# Altium footprint library ComputeCores.PCBLIB: 18 footprints (part 1 of 2)
Each footprint in its own frame and in the unit in brackets; x right, y up, seen from the top. Pads: shape width x height; smd on the part's side, far side on the other; paste and mask are expansions set on the pad; w line width, h text height; cw(c..) or ccw(c..) is an arc to the next point about the centre after c.
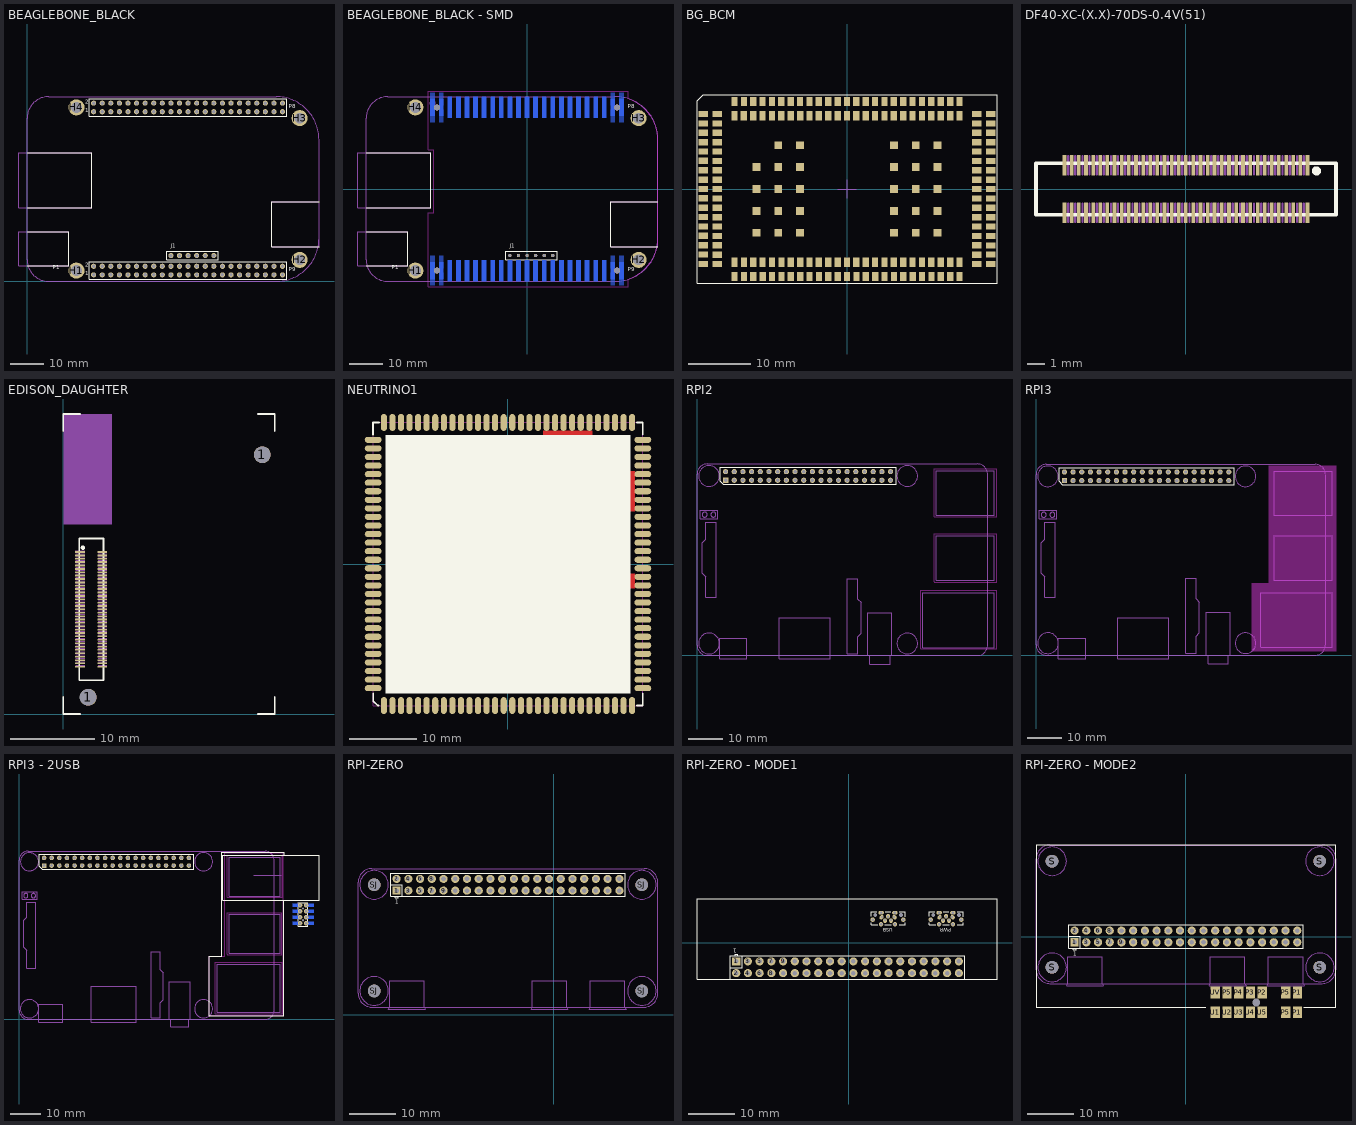
[diagram p0: the footprints below, top view; thin cyan lines are the x and y axes]

## BEAGLEBONE_BLACK [mil]
pads (102):
  round 187.5 hole 125: H1(575,125) H2(3175,250) H3(3175,1900) H4(575,2025)
  round 60 hole 40: J1.1(1675,300) J1.2(1775,300) J1.3(1875,300) J1.4(1975,300) J1.5(2075,300) J1.6(2175,300) P8.1(775,1975) P8.2(775,2075) P8.3(875,1975) P8.4(875,2075) P8.5(975,1975) P8.6(975,2075) P8.7(1075,1975) P8.8(1075,2075) P8.9(1175,1975) P8.10(1175,2075) P8.11(1275,1975) P8.12(1275,2075) P8.13(1375,1975) P8.14(1375,2075) P8.15(1475,1975) P8.16(1475,2075) P8.17(1575,1975) P8.18(1575,2075) P8.19(1675,1975) P8.20(1675,2075) P8.21(1775,1975) P8.22(1775,2075) P8.23(1875,1975) P8.24(1875,2075) P8.25(1975,1975) P8.26(1975,2075) P8.27(2075,1975) P8.28(2075,2075) P8.29(2175,1975) P8.30(2175,2075) P8.31(2275,1975) P8.32(2275,2075) P8.33(2375,1975) P8.34(2375,2075) P8.35(2475,1975) P8.36(2475,2075) P8.37(2575,1975) P8.38(2575,2075) P8.39(2675,1975) P8.40(2675,2075) P8.41(2775,1975) P8.42(2775,2075) P8.43(2875,1975) P8.44(2875,2075) P8.45(2975,1975) P8.46(2975,2075) P9.1(775,75) P9.2(775,175) P9.3(875,75) P9.4(875,175) P9.5(975,75) P9.6(975,175) P9.7(1075,75) P9.8(1075,175) P9.9(1175,75) P9.10(1175,175) P9.11(1275,75) P9.12(1275,175) P9.13(1375,75) P9.14(1375,175) P9.15(1475,75) P9.16(1475,175) P9.17(1575,75) P9.18(1575,175) P9.19(1675,75) P9.20(1675,175) P9.21(1775,75) P9.22(1775,175) P9.23(1875,75) P9.24(1875,175) P9.25(1975,75) P9.26(1975,175) P9.27(2075,75) P9.28(2075,175) P9.29(2175,75) P9.30(2175,175) P9.31(2275,75) P9.32(2275,175) P9.33(2375,75) P9.34(2375,175) P9.35(2475,75) P9.36(2475,175) P9.37(2575,75) P9.38(2575,175) P9.39(2675,75) P9.40(2675,175) P9.41(2775,75) P9.42(2775,175) P9.43(2875,75) P9.44(2875,175) P9.45(2975,75) P9.46(2975,175)
Top Overlay:
  lines w5: 0,182 485,182 485,575 0,575 ; 0,855 754,855 755,1495 0,1495 ; 3400,405 2850,405 2850,925 3400,925 ; 725,25 725,225 3025,225 3025,25 725,25 ; 725,1925 725,2125 3025,2125 3025,1925 725,1925 ; 1625,250 1625,350 2225,350 2225,250 1625,250
  text "P1" at 298,124 h77.5
  text "1" at 675,1950 h77.5
  text "2" at 675,2050 h77.5
  text "2" at 675,150 h77.5
  text "1" at 675,50 h77.5
  text "J1" at 1675,375 h77.5
  text "P8" at 3050,2000 h77.5
  text "P9" at 3050,100 h77.5
Mechanical 16:
  lines w5: -94.49,574.8 -94.49,181 485,181 485,575 -94.49,575 ; -94.49,855 754,855 755,1495 -94.49,1495 ; -94.49,855.12 -94.49,1494.88 ; 3400,405 2850,405 2850,925 3400,925 ; 3400,405.12 3400,500 ; 3400,500 cw(c2900,500) 2900,0 250,0 cw(c250,250) 0,250 0,1900 cw(c250,1900) 250,2150 2900,2150 cw(c2900,1650) 3400,1650 3400,500
3D body "BEAGLEBONE_BLACK.STEP": height 553.15, standoff -209.5, extent -98,0 3463.02,2151.95

## BEAGLEBONE_BLACK - SMD [mm]
pads (106):
  round 4.763 hole 3.175: H1(-33.02,-24.13) H2(33.02,-20.955) H3(33.02,20.955) H4(-33.02,24.13)
  round 1 hole 1: J1.1(-5.08,-19.685) J1.2(-2.54,-19.685) J1.3(0,-19.685) J1.4(2.54,-19.685) J1.5(5.08,-19.685) J1.6(7.62,-19.685)
  round 1.73 hole 1.73 unplated: None(-26.669,-24.133) None(-26.669,24.127) None(26.669,-24.133) None(26.669,24.127)
  rect 1.27x2.5 smd far side: P8.1(-27.94,22.86) P8.2(-27.94,25.4) P8.3(-25.4,22.86) P8.4(-25.4,25.4) P8.43(25.4,22.86) P8.44(25.4,25.4) P8.45(27.94,22.86) P8.46(27.94,25.4) P9.1(-27.94,-25.4) P9.2(-27.94,-22.86) P9.3(-25.4,-25.4) P9.4(-25.4,-22.86) P9.43(25.4,-25.4) P9.44(25.4,-22.86) P9.45(27.94,-25.4) P9.46(27.94,-22.86)
  rect 1.27x3.68 smd far side: P8.5(-22.86,22.86) P8.6(-22.86,25.4) P8.7(-20.32,22.86) P8.8(-20.32,25.4) P8.9(-17.78,22.86) P8.10(-17.78,25.4) P8.11(-15.24,22.86) P8.12(-15.24,25.4) P8.13(-12.7,22.86) P8.14(-12.7,25.4) P8.15(-10.16,22.86) P8.16(-10.16,25.4) P8.17(-7.62,22.86) P8.18(-7.62,25.4) P8.19(-5.08,22.86) P8.20(-5.08,25.4) P8.21(-2.54,22.86) P8.22(-2.54,25.4) P8.23(0,22.86) P8.24(0,25.4) P8.25(2.54,22.86) P8.26(2.54,25.4) P8.27(5.08,22.86) P8.28(5.08,25.4) P8.29(7.62,22.86) P8.30(7.62,25.4) P8.31(10.16,22.86) P8.32(10.16,25.4) P8.33(12.7,22.86) P8.34(12.7,25.4) P8.35(15.24,22.86) P8.36(15.24,25.4) P8.37(17.78,22.86) P8.38(17.78,25.4) P8.39(20.32,22.86) P8.40(20.32,25.4) P8.41(22.86,22.86) P8.42(22.86,25.4) P9.5(-22.86,-25.4) P9.6(-22.86,-22.86) P9.7(-20.32,-25.4) P9.8(-20.32,-22.86) P9.9(-17.78,-25.4) P9.10(-17.78,-22.86) P9.11(-15.24,-25.4) P9.12(-15.24,-22.86) P9.13(-12.7,-25.4) P9.14(-12.7,-22.86) P9.15(-10.16,-25.4) P9.16(-10.16,-22.86) P9.17(-7.62,-25.4) P9.18(-7.62,-22.86) P9.19(-5.08,-25.4) P9.20(-5.08,-22.86) P9.21(-2.54,-25.4) P9.22(-2.54,-22.86) P9.23(0,-25.4) P9.24(0,-22.86) P9.25(2.54,-25.4) P9.26(2.54,-22.86) P9.27(5.08,-25.4) P9.28(5.08,-22.86) P9.29(7.62,-25.4) P9.30(7.62,-22.86) P9.31(10.16,-25.4) P9.32(10.16,-22.86) P9.33(12.7,-25.4) P9.34(12.7,-22.86) P9.35(15.24,-25.4) P9.36(15.24,-22.86) P9.37(17.78,-25.4) P9.38(17.78,-22.86) P9.39(20.32,-25.4) P9.40(20.32,-22.86) P9.41(22.86,-25.4) P9.42(22.86,-22.86)
Bottom Layer:
  region: 26.034,28.443 26.034,25.273 25.524,24.763 24.764,24.763 24.764,28.443
  region: 27.304,28.443 27.304,25.273 27.814,24.763 28.574,24.763 28.574,28.443
  region: 26.034,19.811 26.034,22.981 25.524,23.491 24.764,23.491 24.764,19.811
  region: 27.304,19.811 27.304,22.981 27.814,23.491 28.574,23.491 28.574,19.811
  region: -27.304,19.811 -27.304,22.981 -27.814,23.491 -28.574,23.491 -28.574,19.811
  region: -26.034,19.811 -26.034,22.981 -25.524,23.491 -24.764,23.491 -24.764,19.811
  region: -27.304,28.443 -27.304,25.273 -27.814,24.763 -28.574,24.763 -28.574,28.443
  region: -26.034,28.443 -26.034,25.273 -25.524,24.763 -24.764,24.763 -24.764,28.443
  region: -26.034,-19.817 -26.034,-22.987 -25.524,-23.497 -24.764,-23.497 -24.764,-19.817
  region: -27.304,-19.817 -27.304,-22.987 -27.814,-23.497 -28.574,-23.497 -28.574,-19.817
  region: -26.034,-28.449 -26.034,-25.279 -25.524,-24.769 -24.764,-24.769 -24.764,-28.449
  region: -27.304,-28.449 -27.304,-25.279 -27.814,-24.769 -28.574,-24.769 -28.574,-28.449
  region: 27.304,-28.449 27.304,-25.279 27.814,-24.769 28.574,-24.769 28.574,-28.449
  region: 26.034,-28.449 26.034,-25.279 25.524,-24.769 24.764,-24.769 24.764,-28.449
  region: 27.304,-19.817 27.304,-22.987 27.814,-23.497 28.574,-23.497 28.574,-19.817
  region: 26.034,-19.817 26.034,-22.987 25.524,-23.497 24.764,-23.497 24.764,-19.817
Top Overlay:
  rectangle: -5.405,-20.01 -4.755,-19.36
  lines w0.127: -47.625,-22.682 -35.306,-22.682 -35.306,-12.7 -47.625,-12.7 ; -47.625,-5.588 -28.473,-5.588 -28.448,10.668 -47.625,10.668 ; 38.735,-17.018 24.765,-17.018 24.765,-3.81 38.735,-3.81 ; -6.35,-20.955 -6.35,-18.415 8.89,-18.415 8.89,-20.955 -6.35,-20.955
  text "P1" at -40.056,-24.155 h1.97
  text "J1" at -5.08,-17.78 h1.97
  text "P8" at 29.845,23.495 h1.97
  text "P9" at 29.845,-24.765 h1.97
Bottom Overlay:
  lines w0.127: -29.21,-26.67 29.21,-26.67 29.21,-21.59 -29.21,-21.59 -29.21,-26.67 ; -29.21,21.59 -29.21,26.67 29.21,26.67 29.21,21.59 -29.21,21.59
  text "2" at -29.58,24.64 h1.97
  text "1" at -29.58,22.1 h1.97
  text "2" at -29.58,-23.345 h1.97
  text "1" at -29.58,-25.885 h1.97
Keep-Out Layer:
  lines w0.127: -29.21,-28.95 -29.21,-27.305 -29.21,-22.638 -29.21,-6.985 -27.559,-6.985 -27.559,11.684 -29.21,11.684 -29.21,28.95 30,28.95 30,26.647 cw(c26.013,14.537) 38.75,15.075 38.75,-15.075 cw(c26.013,-14.537) 30,-26.647 30,-28.95 -29.21,-28.95
Mechanical 4:
  circle w0.4: c-27.94,25.4 r0.662
Mechanical 16:
  lines w0.127: -50.025,-12.705 -50.025,-22.708 -35.306,-22.708 -35.306,-12.7 -50.025,-12.7 ; -50.025,-5.588 -28.473,-5.588 -28.448,10.668 -50.025,10.668 ; -50.025,-5.585 -50.025,10.665 ; 38.735,-17.018 24.765,-17.018 24.765,-3.81 38.735,-3.81 ; 38.735,-17.015 38.735,-14.605 ; 38.735,-14.605 cw(c26.035,-14.605) 26.035,-27.305 -41.275,-27.305 cw(c-41.275,-20.955) -47.625,-20.955 -47.625,20.955 cw(c-41.275,20.955) -41.275,27.305 26.035,27.305 cw(c26.035,14.605) 38.735,14.605 38.735,-14.605
3D body "BEAGLEBONE_BLACK.STEP": height 17.93, standoff -1.44, extent -50.114,-27.305 40.336,27.355
3D body "TSM-123-01-T-DV-A.stp": height 9.66, standoff -1.26, extent -29.232,20.356 29.188,28.053
3D body "TSM-123-01-T-DV-A.stp": height 9.66, standoff -1.26, extent -29.232,-27.904 29.188,-20.207

## BG_BCM [mm]
pads (197):
  rect 1.5x1 smd: 1(-23,12) 2(-23,10.5) 3(-23,9) 4(-23,7.5) 5(-23,6) 6(-23,4.5) 7(-23,3) 8(-23,1.5) 9(-23,0) 10(-23,-1.5) 11(-23,-3) 12(-23,-4.5) 13(-23,-6) 14(-23,-7.5) 15(-23,-9) 16(-23,-10.5) 17(-23,-12) 18(-20.75,12) 19(-20.75,10.5) 20(-20.75,9) 21(-20.75,7.5) 22(-20.75,6) 23(-20.75,4.5) 24(-20.75,3) 25(-20.75,1.5) 26(-20.75,0) 27(-20.75,-1.5) 28(-20.75,-3) 29(-20.75,-4.5) 30(-20.75,-6) 31(-20.75,-7.5) 32(-20.75,-9) 33(-20.75,-10.5) 34(-20.75,-12) 85(23,-12) 86(23,-10.5) 87(23,-9.025) 88(23,-7.5) 89(23,-6) 90(23,-4.5) 91(23,-3) 92(23,-1.5) 93(23,0) 94(23,1.5) 95(23,3) 96(23,4.5) 97(23,6) 98(23,7.5) 99(23,9) 100(23,10.5) 101(23,12) 102(20.75,-12) 103(20.75,-10.5) 104(20.75,-9) 105(20.75,-7.5) 106(20.75,-6) 107(20.75,-4.5) 108(20.75,-3) 109(20.75,-1.5) 110(20.75,0) 111(20.75,1.5) 112(20.75,3) 113(20.75,4.5) 114(20.75,6) 115(20.75,7.5) 116(20.75,9) 117(20.75,10.5) 118(20.75,12)
  rect 1x1.5 smd: 35(-18,-14) 36(-16.5,-14) 37(-15,-14) 38(-13.5,-14) 39(-12,-14) 40(-10.5,-14) 41(-9,-14) 42(-7.5,-14) 43(-6,-14) 44(-4.5,-14) 45(-3,-14) 46(-1.5,-14) 47(0,-14) 48(1.5,-14) 49(3,-14) 50(4.5,-14) 51(6,-14) 52(7.5,-14) 53(9,-14) 54(10.5,-14) 55(12,-14) 56(13.5,-14) 57(15,-14) 58(16.5,-14) 59(18,-14) 60(-18,-11.75) 61(-16.5,-11.75) 62(-15,-11.75) 63(-13.5,-11.75) 64(-12,-11.75) 65(-10.5,-11.75) 66(-9,-11.75) 67(-7.5,-11.75) 68(-6,-11.75) 69(-4.5,-11.75) 70(-3,-11.75) 71(-1.5,-11.75) 72(0,-11.75) 73(1.5,-11.75) 74(3,-11.75) 75(4.5,-11.75) 76(6,-11.75) 77(7.5,-11.75) 78(9,-11.75) 79(10.5,-11.75) 80(12,-11.75) 81(13.5,-11.75) 82(15,-11.75) 83(16.5,-11.75) 84(18,-11.75) 119(18,14) 120(16.5,14) 121(15,14) 122(13.5,14) 123(12,14) 124(10.5,14) 125(9,14) 126(7.5,14) 127(6,14) 128(4.5,14) 129(3,14) 130(1.5,14) 131(0,14) 132(-1.5,14) 133(-3,14) 134(-4.5,14) 135(-6,14) 136(-7.5,14) 137(-9,14) 138(-10.5,14) 139(-12,14) 140(-13.5,14) 141(-15,14) 142(-16.5,14) 143(-18,14) 144(18,11.75) 145(16.5,11.75) 146(15,11.75) 147(13.5,11.75) 148(12,11.75) 149(10.5,11.75) 150(9,11.75) 151(7.5,11.75) 152(6,11.75) 153(4.5,11.75) 154(3,11.75) 155(1.5,11.75) 156(0,11.75) 157(-1.5,11.75) 158(-3,11.75) 159(-4.5,11.75) 160(-6,11.75) 161(-7.5,11.75) 162(-9,11.75) 163(-10.5,11.75) 164(-12,11.75) 165(-13.5,11.75) 166(-15,11.75) 167(-16.5,11.75) 168(-18,11.75)
  rect 1.25x1.25 smd: A2(-14.5,3.5) A3(-14.5,0) A4(-14.5,-3.5) A5(-14.5,-7) B1(-11,7) B2(-11,3.5) B3(-11,0) B4(-11,-3.5) B5(-11,-7) C1(-7.5,7) C2(-7.5,3.5) C3(-7.5,0) C4(-7.5,-3.5) C5(-7.5,-7) G1(7.5,7) G2(7.5,3.5) G3(7.5,0) G4(7.5,-3.5) G5(7.5,-7) H1(11,7) H2(11,3.5) H3(11,0) H4(11,-3.5) H5(11,-7) I1(14.5,7) I2(14.5,3.5) I3(14.5,0) I4(14.5,-3.5) I5(14.5,-7)
Top Overlay:
  lines w0.2: -24,-15.11 -24,14.1 -22.99,15.11 24,15.11 24,-15.11 -24,-15.11
Mechanical 2:
  lines w0.2: -1.5,0 0,0 ; 0,-1.5 0,0 ; 0,1.5 0,0 ; 1.5,0 0,0
3D body "CM01_BeagleCORE.step": height 3.23, standoff 0.01, extent -24,-15.1 24,15.1

## DF40-XC-(X.X)-70DS-0.4V(51) [mil]
pads (70):
  rect 8x45 smd: 1(268,52) 2(268,-51.97) 3(252,52) 4(252,-51.97) 5(237,52) 6(237,-51.97) 7(221,52) 8(221,-51.97) 9(205,52) 10(205,-51.97) 11(189,52) 12(189,-51.97) 13(174,52) 14(174,-51.97) 15(158,52) 16(158,-51.97) 17(142,52) 18(142,-51.97) 19(126,52) 20(126,-51.97) 21(111,52) 22(111,-51.97) 23(95,52) 24(95,-51.97) 25(79,52) 26(79,-51.97) 27(63,52) 28(63,-51.97) 29(48,52) 30(48,-51.97) 31(32,52) 32(32,-51.97) 33(16,52) 34(16,-51.97) 35(0,52) 36(0,-51.97) 37(-15.75,52) 38(-15.75,-51.97) 39(-31.5,52) 40(-31.5,-51.97) 41(-47.24,52) 42(-47.24,-51.97) 43(-62.99,52) 44(-62.99,-51.97) 45(-78.74,52) 46(-78.74,-51.97) 47(-94.49,52) 48(-94.49,-51.97) 49(-110.24,52) 50(-110.24,-51.97) 51(-125.98,52) 52(-125.98,-51.97) 53(-141.73,52) 54(-141.73,-51.97) 55(-157.48,52) 56(-157.48,-51.97) 57(-173.23,52) 58(-173.23,-51.97) 59(-188.98,52) 60(-188.98,-51.97) 61(-204.72,52) 62(-204.72,-51.97) 63(-220.47,52) 64(-220.47,-51.97) 65(-236.22,52) 66(-236.22,-51.97) 67(-251.97,52) 68(-251.97,-51.97) 69(-267.72,52) 70(-267.72,-51.97)
Top Overlay:
  circle w12: c288,40 r4
  lines w8: -330.71,-56.69 -330.71,57 331,57 331,-56.69 -330.71,-56.69
Mechanical 8:
  lines w5: -259.84,-72.24 -259.84,-32.09 ; -259.84,32 -259.84,73 ; -244.09,-72.24 -244.09,-32.09 ; -244.09,32 -244.09,73 ; -228.35,-72.24 -228.35,-32.09 ; -228.35,32 -228.35,73 ; -212.6,-72.24 -212.6,-32.09 ; -212.6,32 -212.6,73 ; -196.85,-72.24 -196.85,-32.09 ; -196.85,32 -196.85,73 ; -181.1,-72.24 -181.1,-32.09 ; -181.1,32 -181.1,73 ; -165.35,-72.24 -165.35,-32.09 ; -165.35,32 -165.35,73 ; -149.61,-72.24 -149.61,-32.09 ; -149.61,32 -149.61,73 ; -133.86,-72.24 -133.86,-32.09 ; -133.86,32 -133.86,73 ; -118.11,-72.24 -118.11,-32.09 ; -118.11,32 -118.11,73 ; -102.36,-72.24 -102.36,-32.09 ; -102.36,32 -102.36,73 ; -86.61,-72.24 -86.61,-32.09 ; -86.61,32 -86.61,73 ; -70.87,-72.24 -70.87,-32.09 ; -70.87,32 -70.87,73 ; -55.12,-72.24 -55.12,-32.09 ; -55.12,32 -55.12,73 ; -39.37,-72.24 -39.37,-32.09 ; -39.37,32 -39.37,73 ; -23.62,-72.24 -23.62,-32.09 ; -23.62,32 -23.62,73 ; -7.87,-72.24 -7.87,-32.09 ; -7.87,32 -7.87,73 ; 8,-72.24 8,-32.09 ; 8,32 8,73 ; 24,-72.24 24,-32.09 ; 24,32 24,73 ; 40,-72.24 40,-32.09 ; 40,32 40,73 ; 56,-72.24 56,-32.09 ; 56,32 56,73 ; 71,-72.24 71,-32.09 ; 71,32 71,73 ; 87,-72.24 87,-32.09 ; 87,32 87,73 ; 103,-72.24 103,-32.09 ; 103,32 103,73 ; 119,-72.24 119,-32.09 ; 119,32 119,73 ; 134,-72.24 134,-32.09 ; 134,32 134,73 ; 150,-72.24 150,-32.09 ; 150,32 150,73 ; 166,-72.24 166,-32.09 ; 166,32 166,73 ; 182,-72.24 182,-32.09 ; 182,32 182,73 ; 197,-72.24 197,-32.09 ; 197,32 197,73 ; 213,-72.24 213,-32.09 ; 213,32 213,73 ; 229,-72.24 229,-32.09 ; 229,32 229,73 ; 245,-72.24 245,-32.09 ; 245,32 245,73 ; 260,-72.24 260,-32.09 ; 260,32 260,73
3D body "DF40C(2.0)-70DS.stp": height 80.12, standoff 3.35, extent -326.77,-67.07 326.77,66

## EDISON_DAUGHTER [mil]
pads (72):
  rect 45x8 smd: 1(78,755) 2(182,755) 3(78,739) 4(182,739) 5(78,724) 6(182,724) 7(78,708) 8(182,708) 9(78,692) 10(182,692) 11(78,676) 12(182,676) 13(78,661) 14(182,661) 15(78,645) 16(182,645) 17(78,629) 18(182,629) 19(78,613) 20(182,613) 21(78,598) 22(182,598) 23(78,582) 24(182,582) 25(78,566) 26(182,566) 27(78,550) 28(182,550) 29(78,535) 30(182,535) 31(78,519) 32(182,519) 33(78,503) 34(182,503) 35(78,488) 36(182,488) 37(78,472) 38(182,472) 39(78,456) 40(182,456) 41(78,440) 42(182,440) 43(78,425) 44(182,425) 45(78,409) 46(182,409) 47(78,393) 48(182,393) 49(78,377) 50(182,377) 51(78,362) 52(182,362) 53(78,346) 54(182,346) 55(78,330) 56(182,330) 57(78,314) 58(182,314) 59(78,299) 60(182,299) 61(78,283) 62(182,283) 63(78,267) 64(182,267) 65(78,251) 66(182,251) 67(78,236) 68(182,236) 69(78,220) 70(182,220)
  round 79 hole 79: 1(116,78) 1(927,1208)
Top Overlay:
  circle w12: c91,775 r4
  lines w8: 0,79 0,0 79,0 ; 0,1319 0,1398 79,1398 ; 906,0 985,0 985,79 ; 906,1398 985,1398 985,1319 ; 74,157 187,157 187,818 74,818 74,157
Mechanical 8:
  lines w1: 56,761 101,761
  lines w5: 58,228 99,228 ; 58,243 99,243 ; 58,259 99,259 ; 58,275 99,275 ; 58,291 99,291 ; 58,306 99,306 ; 58,322 99,322 ; 58,338 99,338 ; 58,354 99,354 ; 58,369 99,369 ; 58,385 99,385 ; 58,401 99,401 ; 58,417 99,417 ; 58,432 99,432 ; 58,448 99,448 ; 58,464 99,464 ; 58,480 99,480 ; 58,495 99,495 ; 58,511 99,511 ; 58,527 99,527 ; 58,543 99,543 ; 58,558 99,558 ; 58,574 99,574 ; 58,590 99,590 ; 58,606 99,606 ; 58,621 99,621 ; 58,637 99,637 ; 58,653 99,653 ; 58,669 99,669 ; 58,684 99,684 ; 58,700 99,700 ; 58,716 99,716 ; 58,732 99,732 ; 58,747 99,747 ; 163,228 203,228 ; 163,243 203,243 ; 163,259 203,259 ; 163,275 203,275 ; 163,291 203,291 ; 163,306 203,306 ; 163,322 203,322 ; 163,338 203,338 ; 163,354 203,354 ; 163,369 203,369 ; 163,385 203,385 ; 163,401 203,401 ; 163,417 203,417 ; 163,432 203,432 ; 163,448 203,448 ; 163,464 203,464 ; 163,480 203,480 ; 163,495 203,495 ; 163,511 203,511 ; 163,527 203,527 ; 163,543 203,543 ; 163,558 203,558 ; 163,574 203,574 ; 163,590 203,590 ; 163,606 203,606 ; 163,621 203,621 ; 163,637 203,637 ; 163,653 203,653 ; 163,669 203,669 ; 163,684 203,684 ; 163,700 203,700 ; 163,716 203,716 ; 163,732 203,732 ; 163,747 203,747
Mechanical 27:
  region: 228,1398 0,1398 0,882 228,882
Mechanical 28:
  region: 228,1398 0,1398 0,882 228,882
3D body "inteledison_ok_colors.step": height 172.95, standoff 15.47, extent 9,0 993.25,1397.64
3D body "DF40C(2.0)-70DS.stp": height 75.12, standoff -1.65, extent 63.47,160.87 196.54,814.42

## NEUTRINO1 [mm]
pads (120):
  oval 0.9x2.5 smd mask+0.14: 1(-18.415,-21) 2(-17.145,-21) 3(-15.875,-21) 4(-14.605,-21) 5(-13.335,-21) 6(-12.065,-21) 7(-10.795,-21) 8(-9.525,-21) 9(-8.255,-21) 10(-6.985,-21) 11(-5.715,-21) 12(-4.445,-21) 13(-3.175,-21) 14(-1.905,-21) 15(-0.635,-21) 16(0.635,-21) 17(1.905,-21) 18(3.175,-21) 19(4.445,-21) 20(5.715,-21) 21(6.985,-21) 22(8.255,-21) 23(9.525,-21) 24(10.795,-21) 25(12.065,-21) 26(13.335,-21) 27(14.605,-21) 28(15.875,-21) 29(17.145,-21) 30(18.415,-21) 61(18.415,21) 62(17.145,21) 63(15.875,21) 64(14.605,21) 65(13.335,21) 66(12.065,21) 67(10.795,21) 68(9.525,21) 69(8.255,21) 70(6.985,21) 71(5.715,21) 72(4.445,21) 73(3.175,21) 74(1.905,21) 75(0.635,21) 76(-0.635,21) 77(-1.905,21) 78(-3.175,21) 79(-4.445,21) 80(-5.715,21) 81(-6.985,21) 82(-8.255,21) 83(-9.525,21) 84(-10.795,21) 85(-12.065,21) 86(-13.335,21) 87(-14.605,21) 88(-15.875,21) 89(-17.145,21) 90(-18.415,21)
  oval 2.5x0.9 smd mask+0.14: 31(20,-18.415) 32(20,-17.145) 33(20,-15.875) 34(20,-14.605) 35(20,-13.335) 36(20,-12.065) 37(20,-10.795) 38(20,-9.525) 39(20,-8.255) 40(20,-6.985) 41(20,-5.715) 42(20,-4.445) 43(20,-3.175) 44(20,-1.905) 45(20,-0.635) 46(20,0.635) 47(20,1.905) 48(20,3.175) 49(20,4.445) 50(20,5.715) 51(20,6.985) 52(20,8.255) 53(20,9.525) 54(20,10.795) 55(20,12.065) 56(20,13.335) 57(20,14.605) 58(20,15.875) 59(20,17.145) 60(20,18.415) 91(-20,18.415) 92(-20,17.145) 93(-20,15.875) 94(-20,14.605) 95(-20,13.335) 96(-20,12.065) 97(-20,10.795) 98(-20,9.525) 99(-20,8.255) 100(-20,6.985) 101(-20,5.715) 102(-20,4.445) 103(-20,3.175) 104(-20,1.905) 105(-20,0.635) 106(-20,-0.635) 107(-20,-1.905) 108(-20,-3.175) 109(-20,-4.445) 110(-20,-5.715) 111(-20,-6.985) 112(-20,-8.255) 113(-20,-9.525) 114(-20,-10.795) 115(-20,-12.065) 116(-20,-13.335) 117(-20,-14.605) 118(-20,-15.875) 119(-20,-17.145) 120(-20,-18.415)
Top Layer:
  region: 12.515,19.788 5.265,19.788 5.265,19.213 5.261,19.135 5.231,18.981 5.171,18.837 5.084,18.706 4.974,18.596 4.843,18.509 4.699,18.449 4.545,18.419 4.467,18.415 -6.471,18.415 -6.559,18.416 -6.732,18.382 -6.895,18.316 -7.041,18.219 -7.166,18.095 -7.264,17.949 -7.332,17.786 -7.366,17.614 -7.366,17.526 -7.366,-4.143 -7.366,-4.21 -7.34,-4.342 -7.288,-4.467 -7.214,-4.578 -7.119,-4.674 -7.007,-4.748 -6.882,-4.8 -6.75,-4.826 -6.683,-4.826 16.917,-4.826 17.039,-4.826 17.265,-4.732 17.438,-4.559 17.532,-4.333 17.532,-4.211 17.532,-4.032 17.54,-3.952 17.601,-3.805 17.713,-3.693 17.86,-3.632 17.94,-3.624 18.771,-3.624 18.771,-1.456 17.976,-1.456 17.889,-1.448 17.729,-1.381 17.607,-1.259 17.54,-1.099 17.532,-1.012 17.532,7.207 17.563,7.311 17.667,7.503 17.817,7.659 18.004,7.77 18.107,7.806 18.771,7.806 18.771,13.784 18.159,13.784 18.037,13.796 17.81,13.889 17.637,14.062 17.544,14.288 17.532,14.411 17.532,17.993 17.532,18.077 17.468,18.232 17.349,18.351 17.194,18.415 17.11,18.415 13.444,18.415 13.357,18.415 13.185,18.44 13.022,18.499 12.873,18.588 12.744,18.704 12.64,18.844 12.566,19.001 12.524,19.169 12.515,19.256
Top Overlay:
  circle w0.254: c-17.257,-18.354 r0.559
  rectangle: -18.161,-19.177 18.161,19.126
  lines w0.254: -20.025,19.187 -20.025,21 -19.136,21 ; -20,-19.167 -20,-20.335 -19.34,-20.996 -19.162,-20.996 ; 19.141,-20.996 20,-20.996 20,-19.167 ; 19.141,21 20,21 20,19.187
Keep-Out Layer:
  lines w0.127: -20,-21 -20,21 20,21 20,-21 -20,-21
3D body "NEUTRINO1SOM.step": height 3.02, standoff 0.01, extent -20,-21 20,21

## RPI2 [mil]
pads (40):
  rect 60x60 hole 40: 1(330,2017)
  round 60 hole 40: 2(329,2117) 3(429,2017) 4(429,2117) 5(529,2017) 6(529,2117) 7(629,2017) 8(629,2117) 9(729,2017) 10(729,2117) 11(829,2017) 12(829,2117) 13(929,2017) 14(929,2117) 15(1029,2017) 16(1029,2117) 17(1129,2017) 18(1129,2117) 19(1229,2017) 20(1229,2117) 21(1329,2017) 22(1329,2117) 23(1429,2017) 24(1429,2117) 25(1529,2017) 26(1529,2117) 27(1629,2017) 28(1629,2117) 29(1729,2017) 30(1729,2117) 31(1829,2017) 32(1829,2117) 33(1929,2017) 34(1929,2117) 35(2029,2017) 36(2029,2117) 37(2129,2017) 38(2129,2117) 39(2229,2017) 40(2229,2117)
Top Overlay:
  lines w5: 266,2008 266,2166 2293,2166 2293,1969 305,1969 266,2008
Keep-Out Layer:
  lines w10: 2575,75 2575,750 3455,750 3455,80 3450,75 2575,75 ; 2730,850 2730,1400 3450,1400 3450,845 2735,845 2730,850 ; 2730,1600 2730,2150 3455,2150 3455,1600 2730,1600
Mechanical 14:
  circle w5: c138,138 r120
  circle w5: c2422,138 r119
  circle w5: c2422,2067 r119
  circle w5: c138,2067 r119
  circle w5: c89,1622 r29
  circle w5: c189,1622 r29
  lines w5: 1969,0 119,0 cw(c119,119) 0,119 0,2087 cw(c118.5,2086.5) 119,2205 3229,2205 cw(c3229,2087) 3347,2087 3347,119 cw(c3228.5,118.5) 3229,0 2245,0 ; 1969,0 1989,0 ; 1969,0 1969,493 2245,493 2245,0 ; 1989,0 2225,0 ; 1989,0 1989,-98.43 2225,-98.43 2225,0 ; 2225,0 2245,0 ; 40,1575 40,1674 237,1674 237,1575 40,1575 ; 63,945 103,906 103,670 221,670 221,1536 103,1536 103,1339 63,1300 63,945 ; 260,-39.37 575,-39.37 575,197 260,197 260,-39.37 ; 945,-39.37 1536,-39.37 1536,434 945,434 945,-39.37 ; 1733,20 1733,886 1851,886 1851,650 1890,611 1890,256 1851,217 1851,20 1733,20 ; 2599,91 3426,91 3426,721 2599,721 2599,91 ; 2756,867 3426,867 3426,1378 2756,1378 2756,867 ; 2756,1615 2756,2126 3426,2126 3426,1615 3339,1615 2756,1615
  text "RUN" at 288,1575 h49.6
  text "J8" at 237,1930 h49.6
  text "J1" at 209,8 h49.6
  text "J6" at 1489,445 h49.6
  text "J3" at 1721,815 h49.6
  text "J7" at 2304,48 h49.6
  text "J10" at 3327,764 h49.6
  text "J11" at 3331,1422 h49.6
  text "J12" at 3300,2166 h49.6
  text "GPIO" at 552,1890 h62
  text "DISPLAY" at 355,985 h62
  text "PWR IN" at 638,4 h62
  text "HDMI" at 1626,16 h62
  text "CAMERA" at 1709,312 h62
  text "A/V" at 1953,16 h62
  text "ETHERNET" at 3268,79 h62
  text "USB" at 3327,855 h62
  text "USB" at 3213,1560 h62
  text "J4" at 237,1457 h49.6
  text "Raspberry Pi 2 Model B V1.1" at 1150,1700 h108.5
3D body "61304021821.stp": height 337.32, standoff -119.37, extent 267.31,1970 2287,2170
3D body "raspberrypi2_ok_colors1.step": height 558.88, standoff -179.17, extent -80.17,-101 3448.17,2194.27

## RPI3 [mil]
pads (40):
  rect 60x60 hole 40: 1(330,2017)
  round 60 hole 40: 2(329,2117) 3(429,2017) 4(429,2117) 5(529,2017) 6(529,2117) 7(629,2017) 8(629,2117) 9(729,2017) 10(729,2117) 11(829,2017) 12(829,2117) 13(929,2017) 14(929,2117) 15(1029,2017) 16(1029,2117) 17(1129,2017) 18(1129,2117) 19(1229,2017) 20(1229,2117) 21(1329,2017) 22(1329,2117) 23(1429,2017) 24(1429,2117) 25(1529,2017) 26(1529,2117) 27(1629,2017) 28(1629,2117) 29(1729,2017) 30(1729,2117) 31(1829,2017) 32(1829,2117) 33(1929,2017) 34(1929,2117) 35(2029,2017) 36(2029,2117) 37(2129,2017) 38(2129,2117) 39(2229,2017) 40(2229,2117)
Top Overlay:
  lines w5: 266,2008 266,2166 2293,2166 2293,1969 305,1969 266,2008
Keep-Out Layer:
  board cut-out: 2498,51 2498,829 2699,829 2699,2188 3468,2188 3468,51
Keep-Out Layer:
  lines w10: 2498,51 3468,51 3468,2188 2699,2188 2699,829 2498,829 2498,51 ; 2575,75 2575,750 3455,750 3455,80 3450,75 2575,75 ; 2730,850 2730,1400 3450,1400 3450,845 2735,845 2730,850 ; 2730,1600 2730,2150 3455,2150 3455,1600 2730,1600
Mechanical 14:
  circle w5: c138,138 r120
  circle w5: c2422,138 r119
  circle w5: c2422,2067 r119
  circle w5: c138,2067 r119
  circle w5: c89,1622 r29
  circle w5: c189,1622 r29
  lines w5: 1969,0 119,0 cw(c119,119) 0,119 0,2087 cw(c118.5,2086.5) 119,2205 3229,2205 cw(c3229,2087) 3347,2087 3347,119 cw(c3228.5,118.5) 3229,0 2245,0 ; 1969,0 1989,0 ; 1969,0 1969,493 2245,493 2245,0 ; 1989,0 2225,0 ; 1989,0 1989,-98.43 2225,-98.43 2225,0 ; 2225,0 2245,0 ; 40,1575 40,1674 237,1674 237,1575 40,1575 ; 63,945 103,906 103,670 221,670 221,1536 103,1536 103,1339 63,1300 63,945 ; 260,-39.37 575,-39.37 575,197 260,197 260,-39.37 ; 945,-39.37 1536,-39.37 1536,434 945,434 945,-39.37 ; 1733,20 1733,886 1851,886 1851,650 1890,611 1890,256 1851,217 1851,20 1733,20 ; 2599,91 3426,91 3426,721 2599,721 2599,91 ; 2756,867 3426,867 3426,1378 2756,1378 2756,867 ; 2756,1615 2756,2126 3426,2126 3426,1615 3339,1615 2756,1615
  text "RUN" at 288,1575 h49.6
  text "J8" at 237,1930 h49.6
  text "J1" at 209,8 h49.6
  text "J6" at 1489,445 h49.6
  text "J3" at 1721,815 h49.6
  text "J7" at 2304,48 h49.6
  text "J10" at 3327,764 h49.6
  text "J11" at 3331,1422 h49.6
  text "J12" at 3300,2166 h49.6
  text "GPIO" at 552,1890 h62
  text "DISPLAY" at 355,985 h62
  text "PWR IN" at 638,4 h62
  text "HDMI" at 1626,16 h62
  text "CAMERA" at 1709,312 h62
  text "A/V" at 1953,16 h62
  text "ETHERNET" at 3268,79 h62
  text "USB" at 3327,855 h62
  text "USB" at 3213,1560 h62
  text "J4" at 237,1457 h49.6
  text "Raspberry Pi 2 Model B V1.1" at 1150,1700 h108.5
3D body "User Library-Raspberry Pi 3-1.step": height 159.21, standoff -602.2, extent 0,-51.33 3439.84,2205
3D body "61304021821.stp": height 337.32, standoff -119.37, extent 267.31,1970 2287,2170

## RPI3 - 2USB [mil]
pads (58):
  rect 60x60 hole 40: 1(330,2017)
  round 60 hole 40: 2(329,2117) 3(429,2017) 4(429,2117) 5(529,2017) 6(529,2117) 7(629,2017) 8(629,2117) 9(729,2017) 10(729,2117) 11(829,2017) 12(829,2117) 13(929,2017) 14(929,2117) 15(1029,2017) 16(1029,2117) 17(1129,2017) 18(1129,2117) 19(1229,2017) 20(1229,2117) 21(1329,2017) 22(1329,2117) 23(1429,2017) 24(1429,2117) 25(1529,2017) 26(1529,2117) 27(1629,2017) 28(1629,2117) 29(1729,2017) 30(1729,2117) 31(1829,2017) 32(1829,2117) 33(1929,2017) 34(1929,2117) 35(2029,2017) 36(2029,2117) 37(2129,2017) 38(2129,2117) 39(2229,2017) 40(2229,2117)
  rect 78.74x40 smd far side: E1(3628.2,1496.22) E2(3825.06,1496.22) E3(3628.2,1417.48) E5(3628.2,1338.74) E7(3628.2,1260)
  round 60 hole 30: E1(3687.26,1496.22) E2(3766,1496.22) E3(3687.26,1417.48) E4(3766,1417.48) E5(3687.26,1338.74) E6(3766,1338.74) E7(3687.26,1260) E8(3766,1260)
  rect 80x40 smd far side: E4(3825.06,1417.48) E6(3825.06,1338.74) E8(3825.06,1260)
  round 0 hole 27.56 unplated: SJE(3727,1299) SJE(3727,1456)
Top Overlay:
  lines w5: 266,2008 266,2166 2293,2166 2293,1969 305,1969 266,2008
  lines w5.91: 3662,1221 3791,1221 3791,1532 3662,1532 3662,1221
  lines w7.87: 3936,1559 3936,2149 3480,2149 3480,2190 2663,2190 2663,828 2494,828 2494,48 3476,48 3476,1559 3936,1559 ; 3936,1559 2675,1559 2675,2150 3936,2150 3936,1559
Keep-Out Layer:
  lines w10: 2498,51 3468,51 3468,2188 2699,2188 2699,829 2498,829 2498,51 ; 2575,75 2575,750 3455,750 3455,80 3450,75 2575,75 ; 2730,850 2730,1400 3450,1400 3450,845 2735,845 2730,850 ; 2730,1600 2730,2150 3455,2150 3455,1600 2730,1600
Mechanical 1:
  lines w5.91: 3079,1887.66 3441.99,1887.66
Mechanical 14:
  circle w5: c138,138 r120
  circle w5: c2422,138 r119
  circle w5: c2422,2067 r119
  circle w5: c138,2067 r119
  circle w5: c89,1622 r29
  circle w5: c189,1622 r29
  lines w5: 1969,0 119,0 cw(c119,119) 0,119 0,2087 cw(c118.5,2086.5) 119,2205 3229,2205 cw(c3229,2087) 3347,2087 3347,119 cw(c3228.5,118.5) 3229,0 2245,0 ; 1969,0 1989,0 ; 1969,0 1969,493 2245,493 2245,0 ; 1989,0 2225,0 ; 1989,0 1989,-98.43 2225,-98.43 2225,0 ; 2225,0 2245,0 ; 40,1575 40,1674 237,1674 237,1575 40,1575 ; 63,945 103,906 103,670 221,670 221,1536 103,1536 103,1339 63,1300 63,945 ; 260,-39.37 575,-39.37 575,197 260,197 260,-39.37 ; 945,-39.37 1536,-39.37 1536,434 945,434 945,-39.37 ; 1733,20 1733,886 1851,886 1851,650 1890,611 1890,256 1851,217 1851,20 1733,20 ; 2599,91 3426,91 3426,721 2599,721 2599,91 ; 2756,867 3426,867 3426,1378 2756,1378 2756,867 ; 2756,1615 2756,2126 3426,2126 3426,1615 3339,1615 2756,1615
  text "RUN" at 288,1575 h49.6
  text "J8" at 237,1930 h49.6
  text "J1" at 209,8 h49.6
  text "J6" at 1489,445 h49.6
  text "J3" at 1721,815 h49.6
  text "J7" at 2304,48 h49.6
  text "J10" at 3327,764 h49.6
  text "J11" at 3331,1422 h49.6
  text "J12" at 3300,2166 h49.6
  text "GPIO" at 552,1890 h62
  text "DISPLAY" at 355,985 h62
  text "PWR IN" at 638,4 h62
  text "HDMI" at 1626,16 h62
  text "CAMERA" at 1709,312 h62
  text "A/V" at 1953,16 h62
  text "ETHERNET" at 3268,79 h62
  text "USB" at 3327,855 h62
  text "USB" at 3213,1560 h62
  text "J4" at 237,1457 h49.6
  text "Raspberry Pi 2 Model B V1.1" at 1150,1700 h108.5
3D body "480372200.stp": height 127.95, standoff -49.21, extent 3063.91,1617.8 3888.71,2092.21
3D body "User Library-Raspberry Pi 3-1.step": height 159.21, standoff -602.2, extent 0,-51.33 3439.84,2205
3D body "61304021821.stp": height 337.32, standoff -119.37, extent 267.31,1970 2287,2170
3D body "480372200.stp": height -214.57, standoff -391.73, extent 3061.2,1617.8 3886,2092.2
3D body: height 0, standoff -472.44, extent 3800,1554 3862.99,2205
3D body: height 118.11, standoff 0, extent 3800,1570.5 3862.99,2139.5
3D body "m22-5430405_asm.stp": height 15.75, standoff -433.86, extent 3645.25,1219.52 3842.1,1534.48
3D body "m22-6360442_asm.stp": height 23.62, standoff -108.27, extent 3601.92,1220.15 3842.08,1535.11
3D body: height -86.61, standoff -472.44, extent 3800,1199 3862.99,1575

## RPI-ZERO [mil]
pads (44):
  rect 70x70 hole 39.37: 1(-1340,1059.76)
  round 70 hole 39.37: 2(-1340,1159.76) 3(-1240,1059.76) 4(-1240,1159.76) 5(-1140,1059.76) 6(-1140,1159.76) 7(-1040,1059.76) 8(-1040,1159.76) 9(-940,1059.76) 10(-940,1159.76) 11(-840,1059.76) 12(-840,1159.76) 13(-740,1059.76) 14(-740,1159.76) 15(-640,1059.76) 16(-640,1159.76) 17(-540,1059.76) 18(-540,1159.76) 19(-440,1059.76) 20(-440,1159.76) 21(-340,1059.76) 22(-340,1159.76) 23(-240,1059.76) 24(-240,1159.76) 25(-140,1059.76) 26(-140,1159.76) 27(-40,1059.76) 28(-40,1159.76) 29(60,1059.76) 30(60,1159.76) 31(160,1059.76) 32(160,1159.76) 33(260,1059.76) 34(260,1159.76) 35(360,1059.76) 36(360,1159.76) 37(460,1059.76) 38(460,1159.76) 39(560,1059.76) 40(560,1159.76)
  round 108.27 hole 108.27: SJ(-1531.73,204.25) SJ(-1531.73,1109.76) SJ(751.73,204.25) SJ(751.73,1109.76)
Top Overlay:
  lines w5: -1390,1109.76 -1390,1209.76 610,1209.76 610,1009.75 -1290,1009.75 ; -1390,1109.76 -1390,1009.75 -1352.5,1009.75 ; -1390,1109.76 -1290,1109.76 -1290,1009.75 ; -1352.5,1009.75 -1327.5,1009.75 ; -1352.5,1009.75 -1352.5,997.25 -1327.5,997.25 -1327.5,1009.75 ; -1327.5,1009.75 -1290,1009.75
  text "1" at -1352.5,947.25 h34
Mechanical 30:
  circle w5: c-1531.73,204.25 r122.05
  circle w5: c751.73,204.25 r122.05
  circle w5: c751.73,1109.76 r122.05
  circle w5: c-1531.73,1109.76 r122.05
  lines w5: -1409.69,46.76 -1399.84,66.44 -1399.84,292.82 -1104.57,292.82 -1104.57,66.44 -1094.73,46.76 -1409.69,46.76 ; -193.15,46.76 -183.31,66.44 -183.31,292.82 111.97,292.82 111.97,66.44 121.81,46.76 -193.15,46.76 ; 302.91,46.76 312.75,66.44 312.75,292.82 608.03,292.82 608.03,66.44 617.87,46.76 302.91,46.76
  lines w10: -216.77,66.44 -183.31,66.44 111.97,66.44 ; 279.29,66.44 312.75,66.44 608.03,66.44 ; -1669.53,184.56 ccw(c-1551.42,184.56) -1551.42,66.45 -1399.84,66.44 -1104.57,66.44 771.41,66.44 ccw(c771.41,184.56) 889.53,184.56 889.53,1129.43 ccw(c771.41,1129.43) 771.41,1247.54 -1551.42,1247.55 ccw(c-1551.42,1129.43) -1669.53,1129.43 -1669.53,184.56
3D body: height 440.94, standoff 0, extent 631.74,84.25 871.74,324.25
3D body: height 435, standoff 0, extent -1651.72,84.25 -1411.72,324.25
3D body "pin_header_awl254-dg-g40d.stp": height 335.15, standoff -117.61, extent -1389.53,1009.45 610.47,1209.45
3D body "pizero_colored.step": height -451.21, standoff -626.4, extent -1669.53,44.72 889.52,1249.45
3D body "61304021821.stp": height -117.68, standoff -574.37, extent -1399.53,1009.44 620.16,1209.44

## RPI-ZERO - MODE1 [mm]
pads (66):
  rect 1.778x1.778 hole 1: 1(-24.4,-4.017)
  round 1.778 hole 1: 2(-24.4,-6.557) 3(-21.86,-4.017) 4(-21.86,-6.557) 5(-19.32,-4.017) 6(-19.32,-6.557) 7(-16.78,-4.017) 8(-16.78,-6.557) 9(-14.24,-4.017) 10(-14.24,-6.557) 11(-11.7,-4.017) 12(-11.7,-6.557) 13(-9.16,-4.017) 14(-9.16,-6.557) 15(-6.62,-4.017) 16(-6.62,-6.557) 17(-4.08,-4.017) 18(-4.08,-6.557) 19(-1.54,-4.017) 20(-1.54,-6.557) 21(1,-4.017) 22(1,-6.557) 23(3.54,-4.017) 24(3.54,-6.557) 25(6.08,-4.017) 26(6.08,-6.557) 27(8.62,-4.017) 28(8.62,-6.557) 29(11.16,-4.017) 30(11.16,-6.557) 31(13.7,-4.017) 32(13.7,-6.557) 33(16.24,-4.017) 34(16.24,-6.557) 35(18.78,-4.017) 36(18.78,-6.557) 37(21.32,-4.017) 38(21.32,-6.557) 39(23.86,-4.017) 40(23.86,-6.557)
  round 0 hole 0.8 unplated: MT1(11.317,6.057) MT1(23.89,6.057) MT2(5.717,6.057) MT2(18.29,6.057)
  oval 0.8x1 hole 0.45 copper offset -0.09,-0.09 rot 135: P1(19.75,5.657) U1(7.177,5.657)
  oval 0.8x1 hole 0.45 copper offset 0,-0.127: P2(20.43,4.965) P4(21.723,4.965) U2(7.857,4.965) U4(9.15,4.965)
  oval 0.8x1 hole 0.45 copper offset 0,0.127: P3(21.08,5.667) U3(8.507,5.667)
  oval 0.8x1 hole 0.45 copper offset 0.09,-0.09 rot 45: P5(22.41,5.657) U5(9.837,5.657)
  round 0.95 hole 0.55: S(5.177,5.037) S(6.997,4.047) S(9.997,4.047) S(11.827,5.037) S(17.75,5.037) S(19.57,4.047) S(22.57,4.047) S(24.4,5.037)
  oval 1.2x0.8 hole 0.55: S(7.007,6.557) S(9.997,6.557) S(19.58,6.557) S(22.57,6.557)
Top Overlay:
  lines w0.1: -25.67,-7.827 -32.9,-7.827 -32.9,9.516 32.124,9.516 32.124,-7.827 25.13,-7.827
  lines w0.127: -25.607,-5.357 -23.067,-5.357 -23.067,-2.817 ; -24.654,-2.741 -24.654,-2.423 -24.019,-2.423 -24.019,-2.741 ; -25.67,-7.827 -25.67,-2.747 22.59,-2.747 23.542,-2.747 24.177,-2.747 25.13,-2.747 25.13,-5.287 25.13,-7.827 -25.67,-7.827
  lines w0.2: 4.857,5.752 4.857,6.697 6.102,6.697 ; 4.867,4.33 4.867,3.907 6.229,3.907 ; 7.767,3.907 9.226,3.898 ; 7.877,6.727 9.117,6.727 ; 10.887,3.907 12.207,3.907 12.207,4.337 ; 10.897,6.707 12.207,6.707 12.207,5.717 ; 17.43,5.752 17.43,6.697 18.675,6.697 ; 17.44,4.33 17.44,3.907 18.802,3.907 ; 20.34,3.907 21.799,3.898 ; 20.45,6.727 21.69,6.727 ; 23.46,3.907 24.78,3.907 24.78,4.337 ; 23.47,6.707 24.78,6.707 24.78,5.717
  text "1" at -24.273,-1.23 h0.86
  text "PWR" at 22.218,3.166 h0.8
  text "USB" at 9.518,3.166 h0.8
3D body "pin_header_awl254-dg-g40d.stp": height 14, standoff 2.5, extent -25.654,-8.001 25.146,-2.921
3D body "pizero_colored.step": height -3.3, standoff -33.9, extent -32.926,3.112 32.074,7.562
3D body "usb3150.step": height 7.14, standoff -1.29, extent 4.84,3.917 12.19,6.717
3D body "usb3150.step": height 7.14, standoff -1.29, extent 17.413,3.917 24.763,6.717
3D body "pin_header_awl254-dg-g40d.stp": height 32.54, standoff 27.46, extent -25.797,-7.573 25.003,3.927
3D body "61304021821.stp": height -27.76, standoff -32.84, extent -26.043,-2.035 25.257,9.565
3D body "61304021821.stp": height 8.51, standoff -3.09, extent -25.9,-8.001 25.4,-2.921
3D body: height 15, standoff 10, extent -25.162,-4.786 -23.638,-4.532
3D body: height 15, standoff 10, extent -22.622,-4.786 -21.098,-4.532
3D body: height 15, standoff 10, extent -20.082,-4.786 -18.558,-4.532
3D body: height 15, standoff 10, extent -17.542,-4.786 -16.018,-4.532
3D body: height 15, standoff 10, extent -15.002,-4.786 -13.478,-4.532
3D body: height 15, standoff 10, extent -12.462,-4.786 -10.938,-4.532
3D body: height 15, standoff 10, extent -9.922,-4.786 -8.398,-4.532
3D body: height 15, standoff 10, extent -7.382,-4.786 -5.858,-4.532
3D body: height 15, standoff 10, extent -4.842,-4.786 -3.318,-4.532
3D body: height 15, standoff 10, extent -2.302,-4.786 -0.778,-4.532
3D body: height 15, standoff 10, extent 0.238,-4.786 1.762,-4.532
3D body: height 15, standoff 10, extent 2.778,-4.786 4.302,-4.532
3D body: height 15, standoff 10, extent 5.318,-4.786 6.842,-4.532
3D body: height 15, standoff 10, extent 7.858,-4.786 9.382,-4.532
3D body: height 15, standoff 10, extent 10.398,-4.786 11.922,-4.532
3D body: height 15, standoff 10, extent 12.938,-4.786 14.462,-4.532
3D body: height 15, standoff 10, extent 15.478,-4.786 17.002,-4.532
3D body: height 15, standoff 10, extent 18.018,-4.786 19.542,-4.532
3D body: height 15, standoff 10, extent 20.558,-4.786 22.082,-4.532
3D body: height 32.25, standoff 30.25, extent 7.502,-6.487 9.494,-6.387
3D body: height 32.25, standoff 30.25, extent 10.042,-6.487 12.034,-6.387
3D body: height 32.25, standoff 30.25, extent 20.202,-6.487 22.194,-6.387
3D body: height 32.25, standoff 30.25, extent 22.742,-6.487 24.734,-6.387
3D body: height 32.25, standoff 30.25, extent 12.582,-6.487 14.574,-6.387
3D body: height 32.25, standoff 30.25, extent 15.122,-6.487 17.114,-6.387
3D body: height 32.25, standoff 30.25, extent 17.662,-6.487 19.654,-6.387
3D body: height 32.25, standoff 30.25, extent -5.198,-6.487 -3.206,-6.387
3D body: height 32.25, standoff 30.25, extent -2.658,-6.487 -0.666,-6.387
3D body: height 32.25, standoff 30.25, extent -0.118,-6.487 1.874,-6.387
3D body: height 32.25, standoff 30.25, extent 2.422,-6.487 4.414,-6.387
3D body: height 32.25, standoff 30.25, extent 4.962,-6.487 6.954,-6.387
3D body: height 32.25, standoff 30.25, extent -12.818,-6.487 -10.826,-6.387
3D body: height 32.25, standoff 30.25, extent -10.278,-6.487 -8.286,-6.387
3D body: height 32.25, standoff 30.25, extent -7.738,-6.487 -5.746,-6.387
3D body: height 32.25, standoff 30.25, extent -15.358,-6.487 -13.366,-6.387
3D body: height 32.25, standoff 30.25, extent -17.898,-6.487 -15.906,-6.387
3D body: height 32.25, standoff 30.25, extent -20.438,-6.487 -18.446,-6.387
3D body: height 32.25, standoff 30.25, extent -22.978,-6.487 -20.986,-6.387
3D body: height 32.25, standoff 30.25, extent -25.518,-6.487 -23.526,-6.387
3D body: height 15, standoff 10, extent 23.098,-4.786 24.622,-4.532
3D body: height 15, standoff 10, extent 23.098,-6.386 24.622,-6.132
3D body: height 33.5, standoff 10.1, extent -32.782,-6.259 31.988,-4.659
3D body: height 15, standoff 10, extent 20.558,-6.386 22.082,-6.132
3D body: height 15, standoff 10, extent 18.018,-6.386 19.542,-6.132
3D body: height 15, standoff 10, extent 15.478,-6.386 17.002,-6.132
3D body: height 15, standoff 10, extent 12.938,-6.386 14.462,-6.132
3D body: height 15, standoff 10, extent 10.398,-6.386 11.922,-6.132
3D body: height 15, standoff 10, extent 7.858,-6.386 9.382,-6.132
3D body: height 15, standoff 10, extent 5.318,-6.386 6.842,-6.132
3D body: height 15, standoff 10, extent 2.778,-6.386 4.302,-6.132
3D body: height 15, standoff 10, extent 0.238,-6.386 1.762,-6.132
3D body: height 15, standoff 10, extent -2.302,-6.386 -0.778,-6.132
3D body: height 15, standoff 10, extent -4.842,-6.386 -3.318,-6.132
3D body: height 15, standoff 10, extent -7.382,-6.386 -5.858,-6.132
3D body: height 15, standoff 10, extent -9.922,-6.386 -8.398,-6.132
3D body: height 15, standoff 10, extent -12.462,-6.386 -10.938,-6.132
3D body: height 15, standoff 10, extent -15.002,-6.386 -13.478,-6.132
3D body: height 15, standoff 10, extent -17.542,-6.386 -16.018,-6.132
3D body: height 15, standoff 10, extent -20.082,-6.386 -18.558,-6.132
3D body: height 15, standoff 10, extent -22.622,-6.386 -21.098,-6.132
3D body: height 15, standoff 10, extent -25.162,-6.386 -23.638,-6.132
3D body: height 29.71, standoff 27.71, extent -25.518,-6.487 -23.526,-6.387
3D body: height 29.71, standoff 27.71, extent -22.978,-6.487 -20.986,-6.387
3D body: height 29.71, standoff 27.71, extent -20.438,-6.487 -18.446,-6.387
3D body: height 29.71, standoff 27.71, extent -17.898,-6.487 -15.906,-6.387
3D body: height 29.71, standoff 27.71, extent -15.358,-6.487 -13.366,-6.387
3D body: height 29.71, standoff 27.71, extent -12.818,-6.487 -10.826,-6.387
3D body: height 29.71, standoff 27.71, extent -10.278,-6.487 -8.286,-6.387
3D body: height 29.71, standoff 27.71, extent -7.738,-6.487 -5.746,-6.387
3D body: height 29.71, standoff 27.71, extent -5.198,-6.487 -3.206,-6.387
3D body: height 29.71, standoff 27.71, extent -2.658,-6.487 -0.666,-6.387
3D body: height 29.71, standoff 27.71, extent -0.118,-6.487 1.874,-6.387
3D body: height 29.71, standoff 27.71, extent 2.422,-6.487 4.414,-6.387
3D body: height 29.71, standoff 27.71, extent 4.962,-6.487 6.954,-6.387
3D body: height 29.71, standoff 27.71, extent 7.502,-6.487 9.494,-6.387
3D body: height 29.71, standoff 27.71, extent 10.042,-6.487 12.034,-6.387
3D body: height 29.71, standoff 27.71, extent 12.582,-6.487 14.574,-6.387
3D body: height 29.71, standoff 27.71, extent 15.122,-6.487 17.114,-6.387
3D body: height 29.71, standoff 27.71, extent 17.662,-6.487 19.654,-6.387
3D body: height 29.71, standoff 27.71, extent 20.202,-6.487 22.194,-6.387
3D body: height 29.71, standoff 27.71, extent 22.742,-6.487 24.734,-6.387

## RPI-ZERO - MODE2 [mil]
pads (59):
  rect 70x70 hole 39.37: 1(-949.27,-47.25)
  round 70 hole 39.37: 2(-949.27,52.75) 3(-849.27,-47.25) 4(-849.27,52.75) 5(-749.27,-47.25) 6(-749.27,52.75) 7(-649.27,-47.25) 8(-649.27,52.75) 9(-549.27,-47.25) 10(-549.27,52.75) 11(-449.27,-47.25) 12(-449.27,52.75) 13(-349.27,-47.25) 14(-349.27,52.75) 15(-249.27,-47.25) 16(-249.27,52.75) 17(-149.27,-47.25) 18(-149.27,52.75) 19(-49.27,-47.25) 20(-49.27,52.75) 21(50.73,-47.25) 22(50.73,52.75) 23(150.73,-47.25) 24(150.73,52.75) 25(250.73,-47.25) 26(250.73,52.75) 27(350.73,-47.25) 28(350.73,52.75) 29(450.73,-47.25) 30(450.73,52.75) 31(550.73,-47.25) 32(550.73,52.75) 33(650.73,-47.25) 34(650.73,52.75) 35(750.73,-47.25) 36(750.73,52.75) 37(850.73,-47.25) 38(850.73,52.75) 39(950.73,-47.25) 40(950.73,52.75)
  rect 78.74x98.43 smd: P1(951.73,-645.25) P1(951.73,-475.25) P2(651.73,-475.25) P3(551.73,-475.25) P4(451.73,-475.25) P5(351.73,-475.25) P5(851.73,-645.25) P5(851.73,-475.25) U1(251.73,-645.25) U2(351.73,-645.25) U3(451.73,-645.25) U4(551.73,-645.25) U5(651.73,-645.25) UV(251.73,-475.25)
  round 108.27 hole 108.27 unplated: S(-1141.73,-260.25) S(-1141.73,645.25) S(1141.73,-260.25) S(1141.73,645.25)
  round 0 hole 66.93 square unplated: SJ(600.23,-561.01)
Top Overlay:
  lines w5: -999.27,2.75 -999.27,102.75 1000.73,102.75 1000.73,-97.25 -899.27,-97.25 ; -999.27,2.75 -999.27,-97.25 -961.77,-97.25 ; -999.27,2.75 -899.27,2.75 -899.27,-97.25 ; -961.77,-97.25 -936.77,-97.25 ; -961.77,-97.25 -961.77,-109.75 -936.77,-109.75 -936.77,-97.25 ; -936.77,-97.25 -899.27,-97.25
  lines w10: 170.73,-601.01 -1278.27,-601.01 -1278.27,783.99 1280.73,783.99 1280.73,-601.01 1006.73,-601.01
  text "1" at -961.77,-159.75 h34
Mechanical 30:
  circle w5: c-1140,-261.01 r122.05
  circle w5: c1143.46,-261.01 r122.05
  circle w5: c1143.46,644.5 r122.05
  circle w5: c-1140,644.5 r122.05
  lines w5: -1017.96,-418.5 -1008.11,-398.81 -1008.11,-172.43 -712.84,-172.43 -712.84,-398.81 -703,-418.5 -1017.96,-418.5 ; 198.58,-418.5 208.42,-398.81 208.42,-172.43 503.7,-172.43 503.7,-398.81 513.54,-418.5 198.58,-418.5 ; 694.64,-418.5 704.48,-398.81 704.48,-172.43 999.76,-172.43 999.76,-398.81 1009.6,-418.5 694.64,-418.5
  lines w10: 174.96,-398.81 208.42,-398.81 503.7,-398.81 ; 671.02,-398.81 704.48,-398.81 999.76,-398.81 ; -1277.8,-280.7 ccw(c-1159.69,-280.7) -1159.69,-398.81 -1008.11,-398.81 -712.84,-398.81 1163.14,-398.81 ccw(c1163.14,-280.69) 1281.26,-280.7 1281.26,664.18 ccw(c1163.14,664.17) 1163.14,782.29 -1159.69,782.29 ccw(c-1159.69,664.18) -1277.8,664.18 -1277.8,-280.7
3D body "pin_header_awl254-da-g40d.stp": height 315.46, standoff 0.5, extent -999.35,204.45 1000.65,711.54
3D body "female_header_a-bl254-da-g40d.stp": height 197.35, standoff -125.48, extent -1004.27,-56.01 1005.57,440.06
3D body "pizero_colored.step": height -215.22, standoff -390.42, extent -1278.33,-419.73 1280.73,784.99
3D body: height 196.85, standoff 0, extent 1021.73,-380.25 1261.73,-140.25
3D body: height 196.85, standoff 0, extent -1261.73,525.26 -1021.73,765.26
3D body: height 196.85, standoff 0, extent -1261.72,-380.25 -1021.72,-140.25
3D body: height 196.85, standoff 0, extent 1021.73,525.26 1261.73,765.26
3D body: height 98.43, standoff 0, extent 211.73,-595.25 291.73,-589.88
3D body: height 98.43, standoff 0, extent 311.73,-595.25 391.73,-589.88
3D body: height 98.43, standoff 0, extent 411.73,-595.25 491.73,-589.88
3D body: height 98.43, standoff 0, extent 211.73,-530.25 291.73,-524.88
3D body: height 98.43, standoff 0, extent 311.73,-530.25 391.73,-524.88
3D body: height 98.43, standoff 0, extent 411.73,-530.25 491.73,-524.88
3D body: height 98.43, standoff 0, extent 511.73,-530.25 591.73,-524.88
3D body: height 98.43, standoff 0, extent 511.73,-595.25 591.73,-589.88
3D body: height 98.43, standoff 0, extent 811.73,-595.25 891.73,-589.88
3D body: height 98.43, standoff 0, extent 911.73,-595.25 991.73,-589.88
3D body: height 98.43, standoff 0, extent 811.73,-530.25 891.73,-524.88
3D body: height 98.43, standoff 0, extent 911.73,-530.25 991.73,-524.88
3D body: height 98.43, standoff 0, extent 611.73,-595.25 691.73,-589.88
3D body: height 98.43, standoff 0, extent 611.73,-530.25 691.73,-524.88
3D body "USB-RAPSBERRY.step": height 392.23, standoff -58.56, extent 184.87,-592.34 1015.58,-248.08